# Altium footprint library Connectors.PcbLib: 117 footprints (part 2 of 8)
Each footprint in its own frame and in the unit in brackets; x right, y up, seen from the top. Pads: shape width x height; smd on the part's side, far side on the other; paste and mask are expansions set on the pad; w line width, h text height; cw(c..) or ccw(c..) is an arc to the next point about the centre after c.
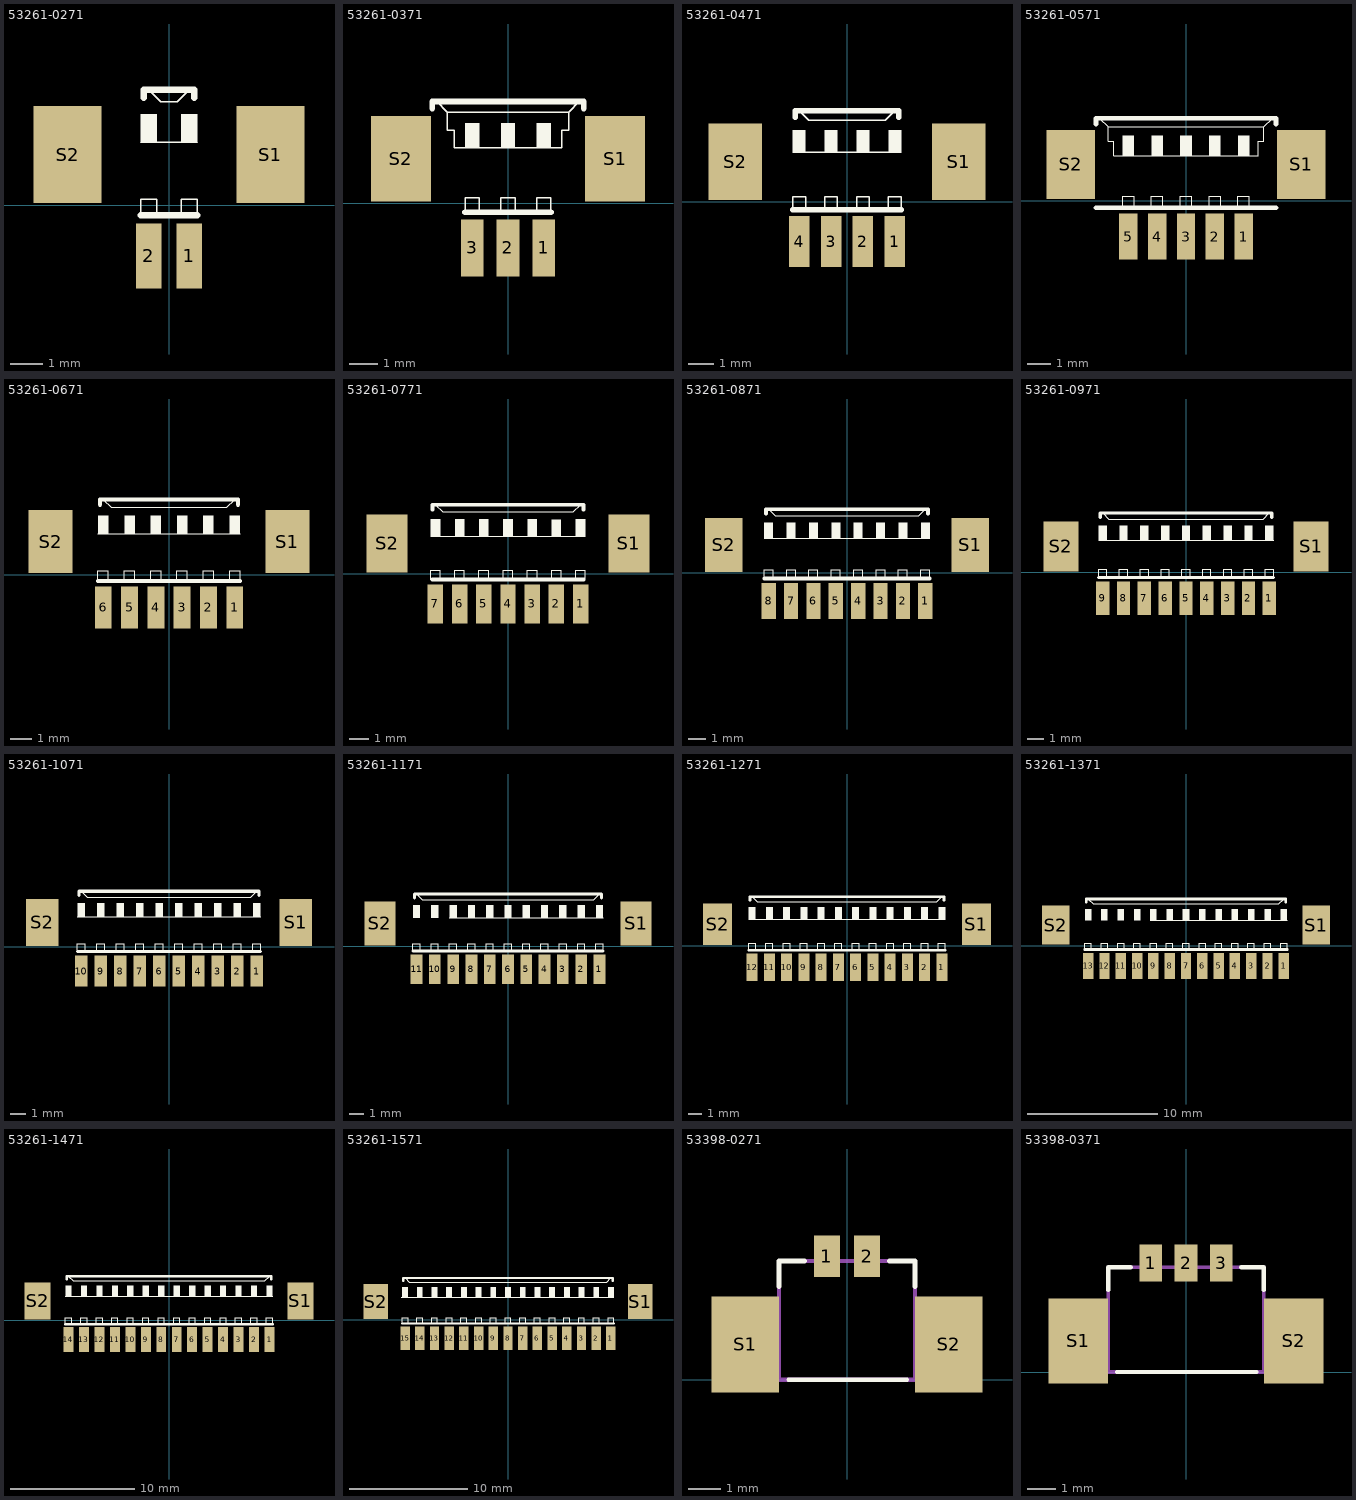
[diagram p1: the footprints below, top view; thin cyan lines are the x and y axes]

## 53261-0271 [mm] "Molex 1.25mm R/A SMD"
height 3.6
pads (4):
  rect 0.8x2 smd: 1(0.625,-1.562) 2(-0.625,-1.562)
  rect 2.1x3 smd: S1(3.125,1.562) S2(-3.125,1.562)
Top Overlay:
  rectangle: -0.875,1.934 -0.375,2.809
  rectangle: 0.375,1.934 0.875,2.809
  lines w0.051: -0.875,-0.312 -0.875,0.188 -0.375,0.188 -0.375,-0.312 ; -0.875,1.937 0.875,1.937 ; -0.625,3.563 -0.25,3.188 0.25,3.188 0.625,3.563 ; 0.375,-0.312 0.375,0.188 0.875,0.188 0.875,-0.312
  lines w0.203: -0.875,-0.311 0.875,-0.311 ; -0.775,3.313 -0.775,3.563 0.625,3.563 0.775,3.563 0.775,3.313
3D body "532610271.stp": height 3.41, standoff 0.01, extent -3.825,-1.537 3.825,3.663

## 53261-0371 [mm] "Molex 1.25mm R/A SMD"
height 3.6
pads (5):
  rect 0.8x2 smd: 1(1.25,-1.562) 2(0,-1.562) 3(-1.25,-1.562)
  rect 2.1x3 smd: S1(3.75,1.562) S2(-3.75,1.562)
Top Overlay:
  rectangle: -1.5,1.938 -1,2.813
  rectangle: -0.25,1.938 0.25,2.813
  rectangle: 1,1.934 1.5,2.809
  lines w0.051: -2.5,3.563 -2.125,3.188 ; -1.5,-0.312 -1.5,0.188 -1,0.188 -1,-0.312 ; -0.25,-0.312 -0.25,0.188 0.25,0.188 0.25,-0.312 ; 1,-0.312 1,0.188 1.5,0.188 1.5,-0.312 ; 2.5,3.563 2.125,3.188 ; -2.125,3.188 -2.125,2.563 -1.875,2.563 -1.875,1.937 1.875,1.937 1.875,2.563 2.125,2.563 2.125,3.188 ; -2.125,3.188 2.125,3.188
  lines w0.203: -2.65,3.313 -2.65,3.563 2.5,3.563 2.65,3.563 2.65,3.313 ; -1.5,-0.311 1.5,-0.311
3D body "532610371.stp": height 3.41, standoff 0.01, extent -4.45,-1.537 4.45,3.663

## 53261-0471 [mm] "Molex 1.25mm R/A SMD"
height 3.6
pads (6):
  rect 0.8x2 smd: 1(1.875,-1.562) 2(0.625,-1.562) 3(-0.625,-1.562) 4(-1.875,-1.562)
  rect 2.1x3 smd: S1(4.375,1.562) S2(-4.375,1.562)
Top Overlay:
  rectangle: -2.125,1.938 -1.625,2.813
  rectangle: -0.875,1.938 -0.375,2.813
  rectangle: 0.375,1.934 0.875,2.809
  rectangle: 1.625,1.934 2.125,2.809
  lines w0.051: -2.125,-0.312 -2.125,0.188 -1.625,0.188 -1.625,-0.312 ; -2.125,1.937 2.125,1.937 ; -1.875,3.563 -1.5,3.188 1.5,3.188 1.875,3.563 ; -0.875,-0.312 -0.875,0.188 -0.375,0.188 -0.375,-0.312 ; 0.375,-0.312 0.375,0.188 0.875,0.188 0.875,-0.312 ; 1.625,-0.312 1.625,0.188 2.125,0.188 2.125,-0.312
  lines w0.203: -2.125,-0.311 2.125,-0.311 ; -2.025,3.313 -2.025,3.563 1.875,3.563 2.025,3.563 2.025,3.313
3D body "532610471.stp": height 3.41, standoff 0.01, extent -5.075,-1.537 5.075,3.663

## 53261-0571 [mm] "Molex 1.25mm R/A SMD"
height 3.6
pads (7):
  rect 0.8x2 smd: 1(2.5,-1.562) 2(1.25,-1.562) 3(0,-1.562) 4(-1.25,-1.562) 5(-2.5,-1.562)
  rect 2.1x3 smd: S1(5,1.562) S2(-5,1.562)
Top Overlay:
  rectangle: 2.25,1.934 2.75,2.809
  rectangle: 1,1.938 1.5,2.813
  rectangle: -0.25,1.938 0.25,2.813
  rectangle: -1.5,1.938 -1,2.813
  rectangle: -2.75,1.938 -2.25,2.813
  lines w0.051: -3.75,3.563 -3.375,3.188 ; -2.75,-0.312 -2.75,0.188 -2.25,0.188 -2.25,-0.312 ; -1.5,-0.312 -1.5,0.188 -1,0.188 -1,-0.312 ; -0.25,-0.312 -0.25,0.188 0.25,0.188 0.25,-0.312 ; 1,-0.312 1,0.188 1.5,0.188 1.5,-0.312 ; 2.25,-0.312 2.25,0.188 2.75,0.188 2.75,-0.312 ; 3.75,3.563 3.375,3.188 ; -3.375,3.188 3.375,3.188 ; -3.375,3.188 -3.375,2.563 -3.125,2.563 -3.125,1.937 3.125,1.937 3.125,2.563 3.375,2.563 3.375,3.188
  lines w0.203: -3.9,-0.311 -3.375,-0.311 3.375,-0.311 3.9,-0.311 ; -3.9,3.313 -3.9,3.563 -3.75,3.563 3.75,3.563 3.9,3.563 3.9,3.313
3D body "532610571.stp": height 3.42, standoff 0.02, extent -5.7,-1.537 5.7,3.663

## 53261-0671 [mm] "Molex 1.25mm R/A SMD"
height 3.6
pads (8):
  rect 0.8x2 smd: 1(3.125,-1.562) 2(1.875,-1.562) 3(0.625,-1.562) 4(-0.625,-1.562) 5(-1.875,-1.562) 6(-3.125,-1.562)
  rect 2.1x3 smd: S1(5.625,1.562) S2(-5.625,1.562)
Top Overlay:
  rectangle: 2.875,1.938 3.375,2.813
  rectangle: -3.375,1.938 -2.875,2.813
  rectangle: -2.125,1.938 -1.625,2.813
  rectangle: -0.875,1.938 -0.375,2.813
  rectangle: 0.375,1.938 0.875,2.813
  rectangle: 1.625,1.934 2.125,2.809
  lines w0.051: -3.375,-0.312 -3.375,0.188 -2.875,0.188 -2.875,-0.312 ; -3.375,1.937 3.375,1.937 ; -3.125,3.563 -2.75,3.188 2.75,3.188 3.125,3.563 ; -2.125,-0.312 -2.125,0.188 -1.625,0.188 -1.625,-0.312 ; -0.875,-0.312 -0.875,0.188 -0.375,0.188 -0.375,-0.312 ; 0.375,-0.312 0.375,0.188 0.875,0.188 0.875,-0.312 ; 1.625,-0.312 1.625,0.188 2.125,0.188 2.125,-0.312 ; 2.875,-0.312 2.875,0.188 3.375,0.188 3.375,-0.312
  lines w0.203: -3.375,-0.311 3.375,-0.311 ; -3.275,3.313 -3.275,3.563 3.125,3.563 3.275,3.563 3.275,3.313
3D body "532610671.stp": height 3.41, standoff 0.01, extent -6.325,-1.537 6.325,3.663

## 53261-0771 [mm] "Molex 1.25mm R/A SMD"
height 3.6
pads (9):
  rect 0.8x2 smd: 1(3.75,-1.562) 2(2.5,-1.562) 3(1.25,-1.562) 4(0,-1.562) 5(-1.25,-1.562) 6(-2.5,-1.562) 7(-3.75,-1.562)
  rect 2.1x3 smd: S1(6.25,1.562) S2(-6.25,1.562)
Top Overlay:
  rectangle: 3.5,1.938 4,2.813
  rectangle: -4,1.938 -3.5,2.813
  rectangle: -2.75,1.938 -2.25,2.813
  rectangle: -1.5,1.938 -1,2.813
  rectangle: -0.25,1.938 0.25,2.813
  rectangle: 1,1.938 1.5,2.813
  rectangle: 2.25,1.934 2.75,2.809
  lines w0.051: -4,-0.312 -4,0.188 -3.5,0.188 -3.5,-0.312 ; -4,1.937 4,1.937 ; -3.75,3.563 -3.375,3.188 3.375,3.188 3.75,3.563 ; -2.75,-0.312 -2.75,0.188 -2.25,0.188 -2.25,-0.312 ; -1.5,-0.312 -1.5,0.188 -1,0.188 -1,-0.312 ; -0.25,-0.312 -0.25,0.188 0.25,0.188 0.25,-0.312 ; 1,-0.312 1,0.188 1.5,0.188 1.5,-0.312 ; 2.25,-0.312 2.25,0.188 2.75,0.188 2.75,-0.312 ; 3.5,-0.312 3.5,0.188 4,0.188 4,-0.312
  lines w0.203: -3.9,-0.311 -3.375,-0.311 3.375,-0.311 3.9,-0.311 ; -3.9,3.313 -3.9,3.563 -3.75,3.563 3.75,3.563 3.9,3.563 3.9,3.313
3D body "532610771.stp": height 3.42, standoff 0.02, extent -6.95,-1.537 6.95,3.663

## 53261-0871 [mm] "Molex 1.25mm R/A SMD"
height 3.6
pads (10):
  rect 0.8x2 smd: 1(4.375,-1.562) 2(3.125,-1.562) 3(1.875,-1.562) 4(0.625,-1.562) 5(-0.625,-1.562) 6(-1.875,-1.562) 7(-3.125,-1.562) 8(-4.375,-1.562)
  rect 2.1x3 smd: S1(6.875,1.562) S2(-6.875,1.562)
Top Overlay:
  rectangle: 2.875,1.934 3.375,2.809
  rectangle: 1.625,1.938 2.125,2.813
  rectangle: 0.375,1.938 0.875,2.813
  rectangle: -0.875,1.938 -0.375,2.813
  rectangle: -2.125,1.938 -1.625,2.813
  rectangle: 4.125,1.938 4.625,2.813
  rectangle: -3.375,1.938 -2.875,2.813
  rectangle: -4.625,1.938 -4.125,2.813
  lines w0.051: -4.625,-0.312 -4.625,0.188 -4.125,0.188 -4.125,-0.312 ; -4.625,1.937 4.625,1.937 ; -4.375,3.563 -4,3.188 4,3.188 4.375,3.563 ; -3.375,-0.312 -3.375,0.188 -2.875,0.188 -2.875,-0.312 ; -2.125,-0.312 -2.125,0.188 -1.625,0.188 -1.625,-0.312 ; -0.875,-0.312 -0.875,0.188 -0.375,0.188 -0.375,-0.312 ; 0.375,-0.312 0.375,0.188 0.875,0.188 0.875,-0.312 ; 1.625,-0.312 1.625,0.188 2.125,0.188 2.125,-0.312 ; 2.875,-0.312 2.875,0.188 3.375,0.188 3.375,-0.312 ; 4.125,-0.312 4.125,0.188 4.625,0.188 4.625,-0.312
  lines w0.203: -4.625,-0.311 4.625,-0.311 ; -4.525,3.313 -4.525,3.563 4.375,3.563 4.525,3.563 4.525,3.313
3D body "532610871.stp": height 3.41, standoff 0.01, extent -7.575,-1.537 7.575,3.663

## 53261-0971 [mm] "Molex 1.25mm R/A SMD"
height 3.6
pads (11):
  rect 0.8x2 smd: 1(5,-1.562) 2(3.75,-1.562) 3(2.5,-1.562) 4(1.25,-1.562) 5(0,-1.562) 6(-1.25,-1.562) 7(-2.5,-1.562) 8(-3.75,-1.562) 9(-5,-1.562)
  rect 2.1x3 smd: S1(7.5,1.562) S2(-7.5,1.562)
Top Overlay:
  rectangle: 4.75,1.938 5.25,2.813
  rectangle: -2.75,1.938 -2.25,2.813
  rectangle: -1.5,1.938 -1,2.813
  rectangle: -0.25,1.938 0.25,2.813
  rectangle: 1,1.938 1.5,2.813
  rectangle: 2.25,1.938 2.75,2.813
  rectangle: 3.5,1.934 4,2.809
  rectangle: -4,1.938 -3.5,2.813
  rectangle: -5.25,1.938 -4.75,2.813
  lines w0.051: -5.25,-0.312 -5.25,0.188 -4.75,0.188 -4.75,-0.312 ; -5.25,1.937 5.25,1.937 ; -5,3.563 -4.625,3.188 4.625,3.188 5,3.563 ; -4,-0.312 -4,0.188 -3.5,0.188 -3.5,-0.312 ; -2.75,-0.312 -2.75,0.188 -2.25,0.188 -2.25,-0.312 ; -1.5,-0.312 -1.5,0.188 -1,0.188 -1,-0.312 ; -0.25,-0.312 -0.25,0.188 0.25,0.188 0.25,-0.312 ; 1,-0.312 1,0.188 1.5,0.188 1.5,-0.312 ; 2.25,-0.312 2.25,0.188 2.75,0.188 2.75,-0.312 ; 3.5,-0.312 3.5,0.188 4,0.188 4,-0.312 ; 4.75,-0.312 4.75,0.188 5.25,0.188 5.25,-0.312
  lines w0.203: -5.25,-0.311 5.25,-0.311 ; -5.15,3.313 -5.15,3.563 -5,3.563 5,3.563 5.15,3.563 5.15,3.313
3D body "532610971.stp": height 3.41, standoff 0.01, extent -8.2,-1.537 8.2,3.663

## 53261-1071 [mm] "Molex 1.25mm R/A SMD"
height 3.6
pads (12):
  rect 0.8x2 smd: 1(5.625,-1.562) 2(4.375,-1.562) 3(3.125,-1.562) 4(1.875,-1.562) 5(0.625,-1.562) 6(-0.625,-1.562) 7(-1.875,-1.562) 8(-3.125,-1.562) 9(-4.375,-1.562) 10(-5.625,-1.562)
  rect 2.1x3 smd: S1(8.125,1.562) S2(-8.125,1.562)
Top Overlay:
  rectangle: -5.875,1.938 -5.375,2.813
  rectangle: -4.625,1.938 -4.125,2.813
  rectangle: -3.375,1.938 -2.875,2.813
  rectangle: -2.125,1.938 -1.625,2.813
  rectangle: 5.375,1.938 5.875,2.813
  rectangle: -0.875,1.938 -0.375,2.813
  rectangle: 0.375,1.938 0.875,2.813
  rectangle: 1.625,1.938 2.125,2.813
  rectangle: 2.875,1.938 3.375,2.813
  rectangle: 4.125,1.934 4.625,2.809
  lines w0.051: -5.875,-0.312 -5.875,0.188 -5.375,0.188 -5.375,-0.312 ; -5.875,1.937 5.875,1.937 ; -5.625,3.563 -5.25,3.188 5.25,3.188 5.625,3.563 ; -4.625,-0.312 -4.625,0.188 -4.125,0.188 -4.125,-0.312 ; -3.375,-0.312 -3.375,0.188 -2.875,0.188 -2.875,-0.312 ; -2.125,-0.312 -2.125,0.188 -1.625,0.188 -1.625,-0.312 ; -0.875,-0.312 -0.875,0.188 -0.375,0.188 -0.375,-0.312 ; 0.375,-0.312 0.375,0.188 0.875,0.188 0.875,-0.312 ; 1.625,-0.312 1.625,0.188 2.125,0.188 2.125,-0.312 ; 2.875,-0.312 2.875,0.188 3.375,0.188 3.375,-0.312 ; 4.125,-0.312 4.125,0.188 4.625,0.188 4.625,-0.312 ; 5.375,-0.312 5.375,0.188 5.875,0.188 5.875,-0.312
  lines w0.203: -5.875,-0.311 5.875,-0.311 ; -5.775,3.313 -5.775,3.563 5.625,3.563 5.775,3.563 5.775,3.313
3D body "532611071.stp": height 3.41, standoff 0.01, extent -8.825,-1.537 8.825,3.663

## 53261-1171 [mm] "Molex 1.25mm R/A SMD"
height 3.6
pads (13):
  rect 0.8x2 smd: 1(6.25,-1.562) 2(5,-1.562) 3(3.75,-1.562) 4(2.5,-1.562) 5(1.25,-1.562) 6(0,-1.562) 7(-1.25,-1.562) 8(-2.5,-1.562) 9(-3.75,-1.562) 10(-5,-1.562) 11(-6.25,-1.562)
  rect 2.1x3 smd: S1(8.75,1.562) S2(-8.75,1.562)
Top Overlay:
  rectangle: 6,1.938 6.5,2.813
  rectangle: -1.5,1.938 -1,2.813
  rectangle: -0.25,1.938 0.25,2.813
  rectangle: 1,1.938 1.5,2.813
  rectangle: 2.25,1.938 2.75,2.813
  rectangle: 3.5,1.938 4,2.813
  rectangle: 4.75,1.934 5.25,2.809
  rectangle: -2.75,1.938 -2.25,2.813
  rectangle: -4,1.938 -3.5,2.813
  rectangle: -5.25,1.938 -4.75,2.813
  rectangle: -6.5,1.938 -6,2.813
  lines w0.051: -6.5,-0.312 -6.5,0.188 -6,0.188 -6,-0.312 ; -6.25,3.563 -5.875,3.188 5.875,3.188 6.25,3.563 ; -5.25,-0.312 -5.25,0.188 -4.75,0.188 -4.75,-0.312 ; -4,-0.312 -4,0.188 -3.5,0.188 -3.5,-0.312 ; -4,1.937 6.5,1.937 ; -2.75,-0.312 -2.75,0.188 -2.25,0.188 -2.25,-0.312 ; -1.5,-0.312 -1.5,0.188 -1,0.188 -1,-0.312 ; -0.25,-0.312 -0.25,0.188 0.25,0.188 0.25,-0.312 ; 1,-0.312 1,0.188 1.5,0.188 1.5,-0.312 ; 2.25,-0.312 2.25,0.188 2.75,0.188 2.75,-0.312 ; 3.5,-0.312 3.5,0.188 4,0.188 4,-0.312 ; 4.75,-0.312 4.75,0.188 5.25,0.188 5.25,-0.312 ; 6,-0.312 6,0.188 6.5,0.188 6.5,-0.312
  lines w0.203: -6.5,-0.311 6.5,-0.311 ; -6.4,3.313 -6.4,3.563 -6.25,3.563 6.25,3.563 6.4,3.563 6.4,3.313
3D body "532611171.stp": height 3.41, standoff 0.01, extent -9.45,-1.537 9.45,3.663

## 53261-1271 [mm] "Molex 1.25mm R/A SMD"
height 3.6
pads (14):
  rect 0.8x2 smd: 1(6.875,-1.562) 2(5.625,-1.562) 3(4.375,-1.562) 4(3.125,-1.562) 5(1.875,-1.562) 6(0.625,-1.562) 7(-0.625,-1.562) 8(-1.875,-1.562) 9(-3.125,-1.562) 10(-4.375,-1.562) 11(-5.625,-1.562) 12(-6.875,-1.562)
  rect 2.1x3 smd: S1(9.375,1.562) S2(-9.375,1.562)
Top Overlay:
  rectangle: -7.125,1.938 -6.625,2.813
  rectangle: -5.875,1.938 -5.375,2.813
  rectangle: -4.625,1.938 -4.125,2.813
  rectangle: -3.375,1.938 -2.875,2.813
  rectangle: -2.125,1.938 -1.625,2.813
  rectangle: -0.875,1.938 -0.375,2.813
  rectangle: 6.625,1.938 7.125,2.813
  rectangle: 0.375,1.938 0.875,2.813
  rectangle: 1.625,1.938 2.125,2.813
  rectangle: 2.875,1.938 3.375,2.813
  rectangle: 4.125,1.938 4.625,2.813
  rectangle: 5.375,1.934 5.875,2.809
  lines w0.051: -7.125,-0.312 -7.125,0.188 -6.625,0.188 -6.625,-0.312 ; -7.125,1.937 7.125,1.937 ; -6.875,3.563 -6.5,3.188 6.5,3.188 6.875,3.563 ; -5.875,-0.312 -5.875,0.188 -5.375,0.188 -5.375,-0.312 ; -4.625,-0.312 -4.625,0.188 -4.125,0.188 -4.125,-0.312 ; -3.375,-0.312 -3.375,0.188 -2.875,0.188 -2.875,-0.312 ; -2.125,-0.312 -2.125,0.188 -1.625,0.188 -1.625,-0.312 ; -0.875,-0.312 -0.875,0.188 -0.375,0.188 -0.375,-0.312 ; 0.375,-0.312 0.375,0.188 0.875,0.188 0.875,-0.312 ; 1.625,-0.312 1.625,0.188 2.125,0.188 2.125,-0.312 ; 2.875,-0.312 2.875,0.188 3.375,0.188 3.375,-0.312 ; 4.125,-0.312 4.125,0.188 4.625,0.188 4.625,-0.312 ; 5.375,-0.312 5.375,0.188 5.875,0.188 5.875,-0.312 ; 6.625,-0.312 6.625,0.188 7.125,0.188 7.125,-0.312
  lines w0.203: -7.125,-0.311 7.125,-0.311 ; -7.025,3.313 -7.025,3.563 6.875,3.563 7.025,3.563 7.025,3.313
3D body "532611271.stp": height 3.41, standoff 0.01, extent -10.075,-1.562 10.075,3.638

## 53261-1371 [mm] "Molex 1.25mm R/A SMD"
height 3.6
pads (15):
  rect 0.8x2 smd: 1(7.5,-1.562) 2(6.25,-1.562) 3(5,-1.562) 4(3.75,-1.562) 5(2.5,-1.562) 6(1.25,-1.562) 7(0,-1.562) 8(-1.25,-1.562) 9(-2.5,-1.562) 10(-3.75,-1.562) 11(-5,-1.562) 12(-6.25,-1.562) 13(-7.5,-1.562)
  rect 2.1x3 smd: S1(10,1.562) S2(-10,1.562)
Top Overlay:
  rectangle: -7.75,1.938 -7.25,2.813
  rectangle: -6.5,1.938 -6,2.813
  rectangle: 7.25,1.938 7.75,2.813
  rectangle: -0.25,1.938 0.25,2.813
  rectangle: 1,1.938 1.5,2.813
  rectangle: 2.25,1.938 2.75,2.813
  rectangle: 3.5,1.938 4,2.813
  rectangle: 4.75,1.938 5.25,2.813
  rectangle: 6,1.934 6.5,2.809
  rectangle: -1.5,1.938 -1,2.813
  rectangle: -2.75,1.938 -2.25,2.813
  rectangle: -4,1.938 -3.5,2.813
  rectangle: -5.25,1.938 -4.75,2.813
  lines w0.051: -7.75,-0.312 -7.75,0.188 -7.25,0.188 -7.25,-0.312 ; -7.5,3.563 -7.125,3.188 7.125,3.188 7.5,3.563 ; -6.5,-0.312 -6.5,0.188 -6,0.188 -6,-0.312 ; -5.25,-0.312 -5.25,0.188 -4.75,0.188 -4.75,-0.312 ; -4,-0.312 -4,0.188 -3.5,0.188 -3.5,-0.312 ; -2.75,-0.312 -2.75,0.188 -2.25,0.188 -2.25,-0.312 ; -2.75,1.937 7.75,1.937 ; -1.5,-0.312 -1.5,0.188 -1,0.188 -1,-0.312 ; -0.25,-0.312 -0.25,0.188 0.25,0.188 0.25,-0.312 ; 1,-0.312 1,0.188 1.5,0.188 1.5,-0.312 ; 2.25,-0.312 2.25,0.188 2.75,0.188 2.75,-0.312 ; 3.5,-0.312 3.5,0.188 4,0.188 4,-0.312 ; 4.75,-0.312 4.75,0.188 5.25,0.188 5.25,-0.312 ; 6,-0.312 6,0.188 6.5,0.188 6.5,-0.312 ; 7.25,-0.312 7.25,0.188 7.75,0.188 7.75,-0.312
  lines w0.203: -7.75,-0.311 7.75,-0.311 ; -7.65,3.313 -7.65,3.563 -7.5,3.563 7.5,3.563 7.65,3.563 7.65,3.313
3D body "532611371.stp": height 3.41, standoff 0.01, extent -10.7,-1.537 10.7,3.663

## 53261-1471 [mm] "Molex 1.25mm R/A SMD"
height 3.6
pads (16):
  rect 0.8x2 smd: 1(8.125,-1.562) 2(6.875,-1.562) 3(5.625,-1.562) 4(4.375,-1.562) 5(3.125,-1.562) 6(1.875,-1.562) 7(0.625,-1.562) 8(-0.625,-1.562) 9(-1.875,-1.562) 10(-3.125,-1.562) 11(-4.375,-1.562) 12(-5.625,-1.562) 13(-6.875,-1.562) 14(-8.125,-1.562)
  rect 2.1x3 smd: S1(10.625,1.562) S2(-10.625,1.562)
Top Overlay:
  rectangle: -8.375,1.938 -7.875,2.813
  rectangle: -7.125,1.938 -6.625,2.813
  rectangle: 6.625,1.934 7.125,2.809
  rectangle: 5.375,1.938 5.875,2.813
  rectangle: 4.125,1.938 4.625,2.813
  rectangle: 2.875,1.938 3.375,2.813
  rectangle: 1.625,1.938 2.125,2.813
  rectangle: 7.875,1.938 8.375,2.813
  rectangle: 0.375,1.938 0.875,2.813
  rectangle: -0.875,1.938 -0.375,2.813
  rectangle: -2.125,1.938 -1.625,2.813
  rectangle: -3.375,1.938 -2.875,2.813
  rectangle: -4.625,1.938 -4.125,2.813
  rectangle: -5.875,1.938 -5.375,2.813
  lines w0.051: -8.375,-0.312 -8.375,0.188 -7.875,0.188 -7.875,-0.312 ; -8.375,1.937 8.375,1.937 ; -8.125,3.563 -7.75,3.188 7.75,3.188 8.125,3.563 ; -7.125,-0.312 -7.125,0.188 -6.625,0.188 -6.625,-0.312 ; -5.875,-0.312 -5.875,0.188 -5.375,0.188 -5.375,-0.312 ; -4.625,-0.312 -4.625,0.188 -4.125,0.188 -4.125,-0.312 ; -3.375,-0.312 -3.375,0.188 -2.875,0.188 -2.875,-0.312 ; -2.125,-0.312 -2.125,0.188 -1.625,0.188 -1.625,-0.312 ; -0.875,-0.312 -0.875,0.188 -0.375,0.188 -0.375,-0.312 ; 0.375,-0.312 0.375,0.188 0.875,0.188 0.875,-0.312 ; 1.625,-0.312 1.625,0.188 2.125,0.188 2.125,-0.312 ; 2.875,-0.312 2.875,0.188 3.375,0.188 3.375,-0.312 ; 4.125,-0.312 4.125,0.188 4.625,0.188 4.625,-0.312 ; 5.375,-0.312 5.375,0.188 5.875,0.188 5.875,-0.312 ; 6.625,-0.312 6.625,0.188 7.125,0.188 7.125,-0.312 ; 7.875,-0.312 7.875,0.188 8.375,0.188 8.375,-0.312
  lines w0.203: -8.375,-0.311 8.375,-0.311 ; -8.275,3.313 -8.275,3.563 8.125,3.563 8.275,3.563 8.275,3.313
3D body "532611471.stp": height 4.11, standoff 0.71, extent -11.325,-1.537 11.325,3.663

## 53261-1571 [mm] "Molex 1.25mm R/A SMD"
height 3.6
pads (17):
  rect 0.8x2 smd: 1(8.75,-1.562) 2(7.5,-1.562) 3(6.25,-1.562) 4(5,-1.562) 5(3.75,-1.562) 6(2.5,-1.562) 7(1.25,-1.562) 8(0,-1.562) 9(-1.25,-1.562) 10(-2.5,-1.562) 11(-3.75,-1.562) 12(-5,-1.562) 13(-6.25,-1.562) 14(-7.5,-1.562) 15(-8.75,-1.562)
  rect 2.1x3 smd: S1(11.25,1.562) S2(-11.25,1.562)
Top Overlay:
  rectangle: -9,1.938 -8.5,2.813
  rectangle: -7.75,1.938 -7.25,2.813
  rectangle: -4,1.938 -3.5,2.813
  rectangle: -2.75,1.938 -2.25,2.813
  rectangle: -1.5,1.938 -1,2.813
  rectangle: -0.25,1.938 0.25,2.813
  rectangle: 7.25,1.934 7.75,2.809
  rectangle: 6,1.938 6.5,2.813
  rectangle: 4.75,1.938 5.25,2.813
  rectangle: 3.5,1.938 4,2.813
  rectangle: 2.25,1.938 2.75,2.813
  rectangle: 1,1.938 1.5,2.813
  rectangle: 8.5,1.938 9,2.813
  rectangle: -5.25,1.938 -4.75,2.813
  rectangle: -6.5,1.938 -6,2.813
  lines w0.051: -9.063,1.937 9,1.937 ; -9,-0.312 -9,0.188 -8.5,0.188 -8.5,-0.312 ; -8.75,3.563 -8.375,3.188 8.375,3.188 8.75,3.563 ; -7.75,-0.312 -7.75,0.188 -7.25,0.188 -7.25,-0.312 ; -6.5,-0.312 -6.5,0.188 -6,0.188 -6,-0.312 ; -5.25,-0.312 -5.25,0.188 -4.75,0.188 -4.75,-0.312 ; -4,-0.312 -4,0.188 -3.5,0.188 -3.5,-0.312 ; -2.75,-0.312 -2.75,0.188 -2.25,0.188 -2.25,-0.312 ; -1.5,-0.312 -1.5,0.188 -1,0.188 -1,-0.312 ; -0.25,-0.312 -0.25,0.188 0.25,0.188 0.25,-0.312 ; 1,-0.312 1,0.188 1.5,0.188 1.5,-0.312 ; 2.25,-0.312 2.25,0.188 2.75,0.188 2.75,-0.312 ; 3.5,-0.312 3.5,0.188 4,0.188 4,-0.312 ; 4.75,-0.312 4.75,0.188 5.25,0.188 5.25,-0.312 ; 6,-0.312 6,0.188 6.5,0.188 6.5,-0.312 ; 7.25,-0.312 7.25,0.188 7.75,0.188 7.75,-0.312 ; 8.5,-0.312 8.5,0.188 9,0.188 9,-0.312
  lines w0.203: -9,-0.311 9,-0.311 ; -8.9,3.313 -8.9,3.563 ; -8.75,3.563 -8.9,3.563 ; 8.9,3.313 8.9,3.563 8.75,3.563 -8.9,3.563
3D body "532611571.stp": height 3.41, standoff 0.01, extent -11.95,-1.537 11.95,3.663

## 53398-0271 [mm] "Molex 1.25mm SMD"
pads (4):
  rect 0.8x1.3 smd: 1(-0.625,3.85) 2(0.625,3.85)
  rect 2.1x3 smd: S1(-3.175,1.1) S2(3.175,1.1)
Top Overlay:
  lines w0.127: -1.825,0 1.875,0
  lines w0.152: -2.125,2.9 -2.125,3.7 -1.325,3.7 ; 1.325,3.7 2.125,3.7 2.125,2.9
Mechanical 13:
  lines w0.127: -3.125,0 3.125,0 ; -2.125,0 -2.125,3.7 2.125,3.7 2.125,0
3D body "533980271.stp": height 4.71, standoff 0.01, extent -3.825,0.025 3.825,4.225

## 53398-0371 [mm] "Molex 1.25mm SMD"
pads (5):
  rect 0.8x1.3 smd: 1(-1.25,3.85) 2(0,3.85) 3(1.25,3.85)
  rect 2.1x3 smd: S1(-3.8,1.1) S2(3.8,1.1)
Top Overlay:
  lines w0.127: -2.45,0 2.5,0
  lines w0.152: -2.75,2.9 -2.75,3.7 -1.95,3.7 ; 1.95,3.7 2.75,3.7 2.75,2.9
Mechanical 13:
  lines w0.127: -4.25,0 3.75,0 ; -2.75,0 -2.75,3.7 2.75,3.7 2.75,0
3D body "533980371.stp": height 4.71, standoff 0.01, extent -4.45,0.025 4.45,4.225